# Altium footprint library Selex_PCBLib.PcbLib: 388 footprints (part 16 of 25)
Each footprint in its own frame and in the unit in brackets; x right, y up, seen from the top. Pads: shape width x height; smd on the part's side, far side on the other; paste and mask are expansions set on the pad; w line width, h text height; cw(c..) or ccw(c..) is an arc to the next point about the centre after c.
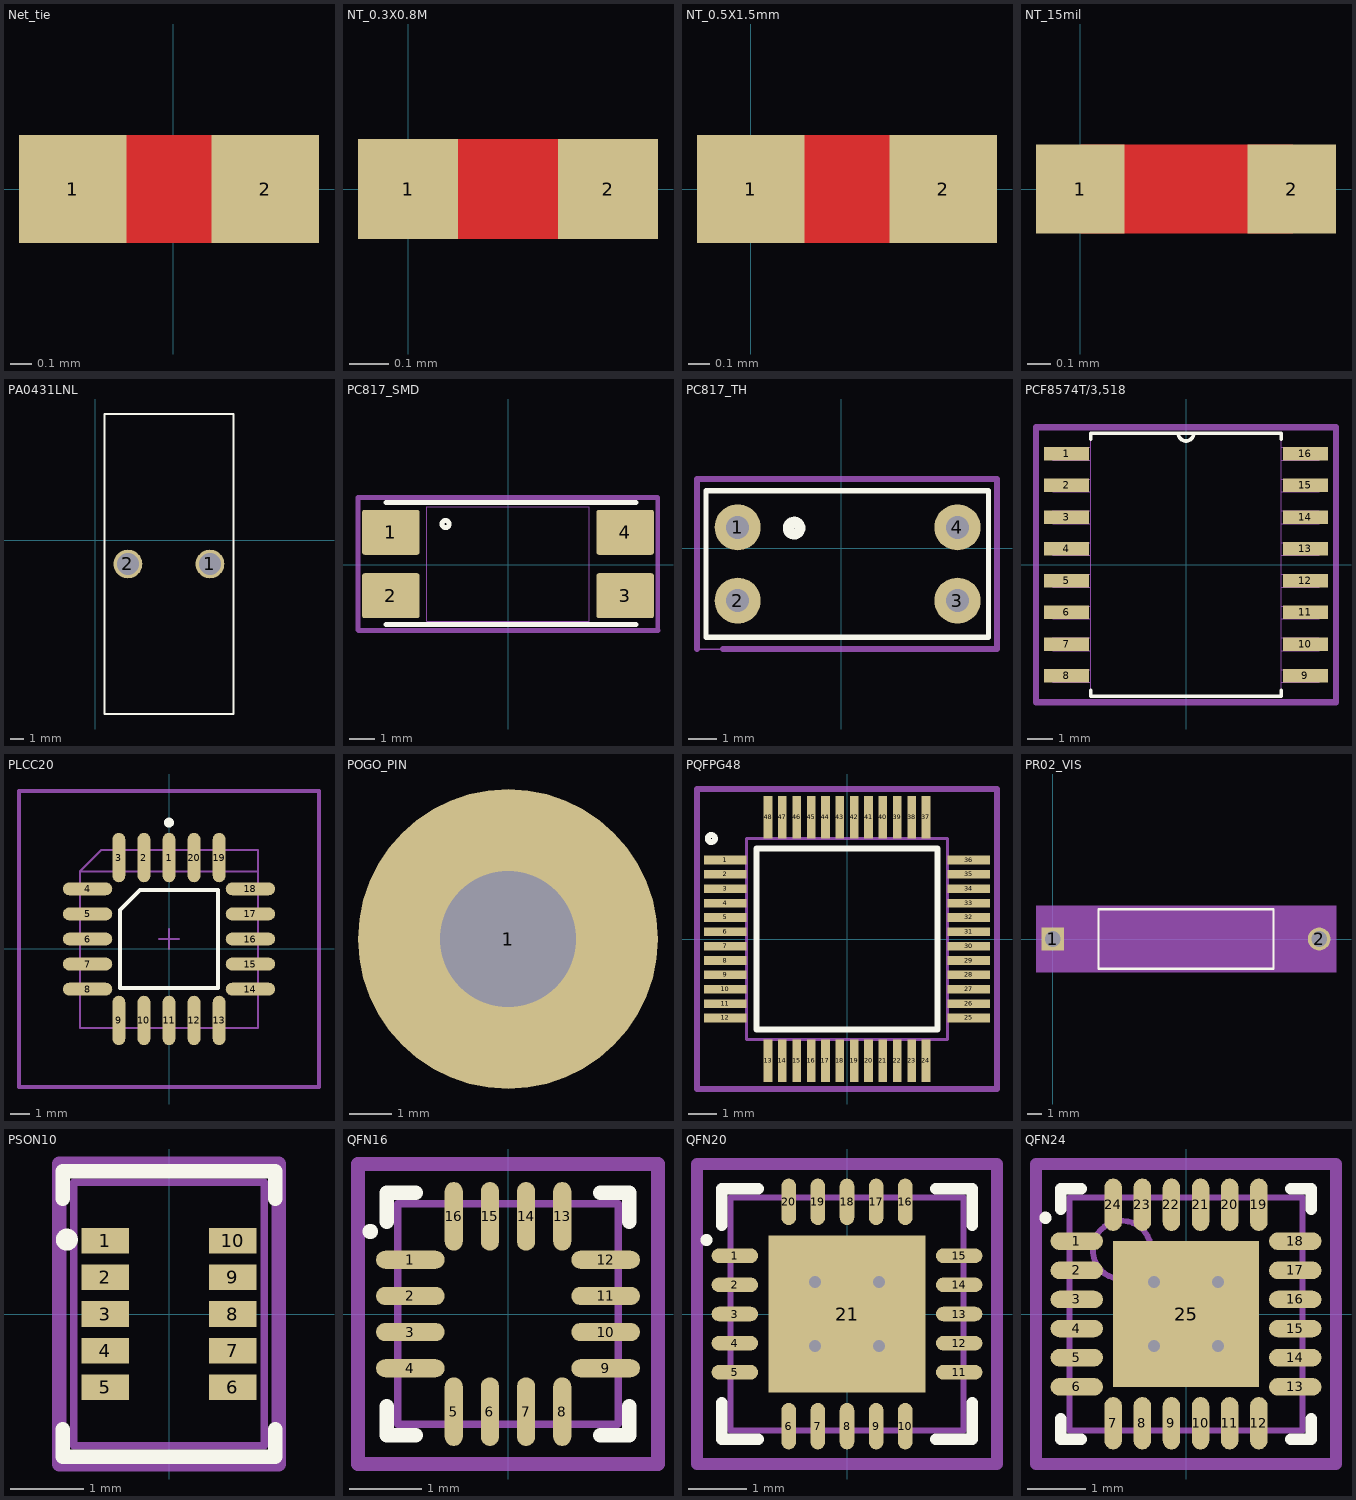
[diagram p15: the footprints below, top view; thin cyan lines are the x and y axes]

## Net_tie [mil]
pads (2):
  rect 20x20 smd paste-11.81 mask+0: 1(-18.7,0) 2(17.05,0)
Top Layer:
  rectangle: -18.7,-10 17.3,10

## NT_0.3X0.8M [mil]
pads (2):
  rect 10x10 smd paste-11.81 mask+0: 1(0,0) 2(20,0)
Top Layer:
  rectangle: 0,-5 20,5

## NT_0.5X1.5mm [mil]
pads (2):
  rect 20x20 smd paste-11.81 mask+0: 1(0,0) 2(35.75,0)
Top Layer:
  rectangle: 0,-10 36,10

## NT_15mil [mil]
pads (2):
  rect 15x15 smd paste-11.81 mask+0: 1(0,0) 2(35.75,0)
Top Layer:
  rectangle: 0,-7.5 36,7.5

## PA0431LNL [mil]
pads (2):
  round 84 hole 64: 1(336.46,-68.9) 2(96.46,-68.9)
Top Overlay:
  lines w6.57: 27.56,-507.87 405.51,-507.87 405.51,370.08 27.56,370.08 27.56,-507.87
3D body "IND_PA0431L_PUL.step": height 874.02, standoff -262.01, extent 30,-505.91 404.02,368.11

## PC817_SMD [mm]
pads (4):
  rrect10% 2.3x1.8 smd mask+0.05: 1(-4.715,1.3) 2(-4.715,-1.24) 3(4.675,-1.24) 4(4.675,1.3)
Top Overlay:
  circle w0.2: c-2.52,1.63 r0.141
  lines w0.2: -4.9,-2.4 5.1,-2.4 ; -4.9,2.5 5.1,2.5
Mechanical 1:
  lines w0.05: -3.27,-2.26 3.23,-2.26 3.23,2.32 -3.27,2.32 -3.27,-2.26
Mechanical 15:
  lines w0.1: -6.03,-2.62 -6.02,-2.63 ; 5.98,-2.63 5.99,-2.64
  lines w0.2: -6.03,-2.62 -6.03,-2.42 -6.03,2.7 5.98,2.7 5.98,-2.63 ; -6.02,-2.63 -5.77,-2.63 -5.76,-2.64 5.99,-2.64
3D body "User Library-PC817_Gullwing.STEP": height 3.75, standoff -0.1, extent -5.02,-2.26 4.98,2.32

## PC817_TH [mm]
pads (4):
  round 1.6 hole 0.8: 1(-3.59,0.72) 2(-3.59,-1.82) 3(4.03,-1.82) 4(4.03,0.72)
Top Overlay:
  circle w0.381: c-1.634,0.695 r0.203
  lines w0.178: -1.05,1.99 -4.69,1.99 -4.69,-3.09 5.11,-3.09 5.11,1.99 -1,1.99
Mechanical 15:
  lines w0.05: -5,-3.5 -4.1,-3.5
  lines w0.2: -5,-3.5 -5,2.4 5.4,2.4 5.4,-3.5 -4.1,-3.5
3D body "SW3DPS-DIP4-DEFAULT.STEP": height 4.31, standoff -3.28, extent -3.844,-3.32 4.156,2.22

## PCF8574T/3,518 [mil]
pads (16):
  rect 71x21 smd: 1(-188,175) 2(-188,125) 3(-188,75) 4(-188,25) 5(-188,-25) 6(-188,-75) 7(-188,-125) 8(-188,-175) 9(188,-175) 10(188,-125) 11(188,-75) 12(188,-25) 13(188,25) 14(188,75) 15(188,125) 16(188,175)
Top Overlay:
  lines w6: -150,-198 -150,-207 150,-207 150,-198 ; -150,198 -150,207 -12,207 ; 150,198 150,207 12,207 ; -12,207 ccw(c0,207) 12,207 ; -12,207 12,207
Mechanical 13:
  lines w0: -12,207 ccw(c0,207) 12,207 ; -12,207 -150,207 -150,-207 150,-207 150,207 12,207 ; -12,207 12,207 ; -210,-185 -150,-185 -150,-165 -210,-165 -210,-185 ; -210,-135 -150,-135 -150,-115 -210,-115 -210,-135 ; -210,-85 -150,-85 -150,-65 -210,-65 -210,-85 ; -210,-35 -150,-35 -150,-15 -210,-15 -210,-35 ; -210,15 -150,15 -150,35 -210,35 -210,15 ; -210,65 -150,65 -150,85 -210,85 -210,65 ; -210,115 -150,115 -150,135 -210,135 -210,115 ; -210,165 -150,165 -150,185 -210,185 -210,165 ; 150,-185 210,-185 210,-165 150,-165 150,-185 ; 150,-135 210,-135 210,-115 150,-115 150,-135 ; 150,-85 210,-85 210,-65 150,-65 150,-85 ; 150,-35 210,-35 210,-15 150,-15 150,-35 ; 150,15 210,15 210,35 150,35 150,15 ; 150,65 210,65 210,85 150,85 150,65 ; 150,115 210,115 210,135 150,135 150,115 ; 150,165 210,165 210,185 150,185 150,165
Mechanical 15:
  lines w10: -236.22,-216.54 236.22,-216.54 236.22,216.54 -39.37,216.54 -236.22,216.54 -236.22,-216.54
3D body "SOT162-1_NXP.step": height 104.09, standoff 0, extent -209.48,-206.49 209.5,206.5

## PLCC20 [mm] "PLCC_20_1P27-8P26"
pads (20):
  oval 0.65x2.5 smd: 1(0,4.625) 2(-1.27,4.625) 3(-2.54,4.625) 9(-2.54,-3.625) 10(-1.27,-3.625) 11(0,-3.625) 12(1.27,-3.625) 13(2.54,-3.625) 19(2.54,4.625) 20(1.27,4.625)
  oval 2.5x0.65 smd: 4(-4.125,3.04) 5(-4.125,1.77) 6(-4.125,0.5) 7(-4.125,-0.77) 8(-4.125,-2.04) 14(4.125,-2.04) 15(4.125,-0.77) 16(4.125,0.5) 17(4.125,1.77) 18(4.125,3.04)
Top Overlay:
  circle w0.25: c0,6.4 r0.127
  lines w0.2: -2.475,-1.975 -2.475,1.975 -1.475,2.975 2.475,2.975 2.475,-1.975 -2.475,-1.975
Mechanical 13:
  lines w0.1: 4.52,3.92 -4.52,3.92 ; -4.52,3.92 -3.42,5.02 4.52,5.02 4.52,-4.02 -4.52,-4.02 -4.52,3.92
Mechanical 15:
  lines w0.1: -0.5,0.5 0.5,0.5 ; 0,0 0,1
  lines w0.2: -7.6,-7 7.6,-7 7.6,8 -7.6,8 -7.6,-7
3D body "540-88-020-17-400-tr.stp": height 4.6, standoff -1.05, extent -7.43,-6.93 7.43,7.93

## POGO_PIN [mm]
pads (1):
  round 7 hole 3.175: 1(16.9,10.65)

## PQFPG48 [mm] "PQFPG48_0P5x8P5"
pads (48):
  rect 1.475x0.3 smd: 1(-4.238,2.75) 2(-4.238,2.25) 3(-4.238,1.75) 4(-4.238,1.25) 5(-4.238,0.75) 6(-4.238,0.25) 7(-4.238,-0.25) 8(-4.238,-0.75) 9(-4.238,-1.25) 10(-4.238,-1.75) 11(-4.238,-2.25) 12(-4.238,-2.75) 25(4.238,-2.75) 26(4.238,-2.25) 27(4.238,-1.75) 28(4.238,-1.25) 29(4.238,-0.75) 30(4.238,-0.25) 31(4.238,0.25) 32(4.238,0.75) 33(4.238,1.25) 34(4.238,1.75) 35(4.238,2.25) 36(4.238,2.75)
  rect 0.3x1.475 smd: 13(-2.75,-4.238) 14(-2.25,-4.238) 15(-1.75,-4.238) 16(-1.25,-4.238) 17(-0.75,-4.238) 18(-0.25,-4.238) 19(0.25,-4.238) 20(0.75,-4.238) 21(1.25,-4.238) 22(1.75,-4.238) 23(2.25,-4.238) 24(2.75,-4.238) 37(2.75,4.238) 38(2.25,4.238) 39(1.75,4.238) 40(1.25,4.238) 41(0.75,4.238) 42(0.25,4.238) 43(-0.25,4.238) 44(-0.75,4.238) 45(-1.25,4.238) 46(-1.75,4.238) 47(-2.25,4.238) 48(-2.75,4.238)
Top Overlay:
  circle w0.2: c-4.725,3.5 r0.125
  lines w0.2: -3.15,-3.15 3.15,-3.15 3.15,3.15 -3.15,3.15 -3.15,-3.15
Mechanical 13:
  lines w0.1: -3.5,-3.5 3.5,-3.5 3.5,3.5 -3.5,3.5 -3.5,-3.5
Mechanical 15:
  lines w0.2: -5.225,-5.225 5.225,-5.225 5.225,5.225 -5.225,5.225 -5.225,-5.225
3D body "BQ76952PFBR.stp": height 1.06, standoff -0.01, extent -4.5,-4.5 4.5,4.5

## PR02_VIS [mil]
pads (2):
  rect 62.68x62.68 hole 43 mask+0: 1(0,0)
  round 62.68 hole 43 mask+0: 2(733.86,0)
Top Overlay:
  lines w6: 125.71,-81.77 608.15,-81.77 608.15,81.77 125.71,81.77 125.71,-81.77
Mechanical 5:
  region: 780.2,-91.77 -46.34,-91.77 -46.34,91.77 780.2,91.77
Mechanical 13:
  lines w1: 0,0 130.71,0 ; 603.15,0 733.86,0 ; 130.71,-76.77 603.15,-76.77 603.15,76.77 130.71,76.77 130.71,-76.77
Mechanical 15:
  region: 120.71,-41.34 -41.34,-41.34 -41.34,41.34 120.71,41.34 120.71,86.77 613.15,86.77 613.15,41.34 775.2,41.34 775.2,-41.34 613.15,-41.34 613.15,-86.77 120.71,-86.77
  lines w6: -41.34,-41.34 -41.34,41.34 120.71,41.34 120.71,86.77 613.15,86.77 613.15,41.34 775.2,41.34 775.2,-41.34 613.15,-41.34 613.15,-86.77 120.71,-86.77 120.71,-41.34 -41.34,-41.34
3D body "PR02_VIS.step": height 153.54, standoff -110, extent -16.34,-76.64 750.2,76.64

## PSON10 [mm] "PSON 10 0P5-1P75"
pads (10):
  rect 0.65x0.35 smd: 1(-0.87,1) 2(-0.87,0.5) 3(-0.87,0) 4(-0.87,-0.5) 5(-0.87,-1) 6(0.87,-1) 7(0.87,-0.5) 8(0.87,0) 9(0.87,0.5) 10(0.87,1)
Top Overlay:
  circle w0.2: c-1.397,1.016 r0.05
  lines w0.2: -1.45,-1.575 -1.45,-1.95 1.45,-1.95 1.45,-1.575 ; -1.45,1.575 -1.45,1.95 1.45,1.95 1.45,1.575
Mechanical 13:
  lines w0.1: -1.3,-1.8 1.3,-1.8 1.3,1.8 -1.3,1.8 -1.3,-1.8
Mechanical 15:
  lines w0.2: -1.5,-2.05 1.5,-2.05 1.5,2.05 -1.5,2.05 -1.5,-2.05
3D body: height 1, standoff 0, extent -1.3,-1.8 1.3,1.8

## QFN16 [mm] "QFN 16 0P5-2P8"
pads (16):
  oval 0.95x0.25 smd: 1(-1.35,0.75) 2(-1.35,0.25) 3(-1.35,-0.25) 4(-1.35,-0.75) 9(1.35,-0.75) 10(1.35,-0.25) 11(1.35,0.25) 12(1.35,0.75)
  oval 0.25x0.95 smd: 5(-0.75,-1.35) 6(-0.25,-1.35) 7(0.25,-1.35) 8(0.75,-1.35) 13(0.75,1.35) 14(0.25,1.35) 15(-0.25,1.35) 16(-0.75,1.35)
Top Overlay:
  circle w0.2: c-1.905,1.143 r0.005
  lines w0.2: -1.675,-1.275 -1.675,-1.675 -1.275,-1.675 ; -1.675,1.275 -1.675,1.675 -1.275,1.675 ; 1.275,-1.675 1.675,-1.675 1.675,-1.275 ; 1.275,1.675 1.675,1.675 1.675,1.275
Mechanical 13:
  lines w0.1: -1.525,-1.525 1.523,-1.525 1.525,-1.523 1.525,1.525 -1.525,1.525 -1.525,-1.525
Mechanical 15:
  lines w0.2: -2.075,-2.075 -2.075,2.075 2.075,2.075 2.075,-2.075 -2.075,-2.075
3D body "ALSRobot-QFN16 3x3.STEP": height 0.9, standoff 0, extent -1.524,-1.524 1.518,1.518

## QFN20 [mm] "QFN 20 0P5-3P8"
pads (21):
  oval 0.8x0.25 smd: 1(-1.925,1) 2(-1.925,0.5) 3(-1.925,0) 4(-1.925,-0.5) 5(-1.925,-1) 11(1.925,-1) 12(1.925,-0.5) 13(1.925,0) 14(1.925,0.5) 15(1.925,1)
  oval 0.25x0.8 smd: 6(-1,-1.925) 7(-0.5,-1.925) 8(0,-1.925) 9(0.5,-1.925) 10(1,-1.925) 16(1,1.925) 17(0.5,1.925) 18(0,1.925) 19(-0.5,1.925) 20(-1,1.925)
  rect 2.7x2.7 smd: 21(0,0)
via -0.55,0.55 diameter 0.5 hole 0.2
via 0.55,0.55 diameter 0.5 hole 0.2
via -0.55,-0.55 diameter 0.5 hole 0.2
via 0.55,-0.55 diameter 0.5 hole 0.2
Top Overlay:
  circle w0.2: c-2.413,1.27 r0.005
  lines w0.2: -2.15,-1.525 -2.15,-2.15 -1.525,-2.15 ; -2.15,1.525 -2.15,2.15 -1.525,2.15 ; 1.525,-2.15 2.15,-2.15 2.15,-1.525 ; 1.525,2.15 2.15,2.15 2.15,1.525
Mechanical 13:
  lines w0.1: -2,-2 -2,2 2,2 2,-2 -2,-2
Mechanical 15:
  lines w0.2: -2.575,-2.575 -2.575,2.575 2.575,2.575 2.575,-2.575 -2.575,-2.575
3D body: height 1, standoff 0, extent -2,-2 2,2
3D body "User Library-QFN20 4x4.STEP": height 0.72, standoff -0.01, extent -2.024,-2.024 2.025,2.025

## QFN24 [mm] "QFN 24 0P5-3P6"
pads (25):
  oval 0.9x0.3 smd: 1(-1.875,1.25) 2(-1.875,0.75) 3(-1.875,0.25) 4(-1.875,-0.25) 5(-1.875,-0.75) 6(-1.875,-1.25) 13(1.875,-1.25) 14(1.875,-0.75) 15(1.875,-0.25) 16(1.875,0.25) 17(1.875,0.75) 18(1.875,1.25)
  oval 0.3x0.9 smd: 7(-1.25,-1.875) 8(-0.75,-1.875) 9(-0.25,-1.875) 10(0.25,-1.875) 11(0.75,-1.875) 12(1.25,-1.875) 19(1.25,1.875) 20(0.75,1.875) 21(0.25,1.875) 22(-0.25,1.875) 23(-0.75,1.875) 24(-1.25,1.875)
  rect 2.5x2.5 smd: 25(0,0)
via 0.55,-0.55 diameter 0.5 hole 0.2
via -0.55,-0.55 diameter 0.5 hole 0.2
via 0.55,0.55 diameter 0.5 hole 0.2
via -0.55,0.55 diameter 0.5 hole 0.2
Top Overlay:
  circle w0.2: c-2.413,1.651 r0.005
  lines w0.2: -2.15,-1.8 -2.15,-2.15 -1.8,-2.15 ; -2.15,1.8 -2.15,2.15 -1.8,2.15 ; 1.8,-2.15 2.15,-2.15 2.15,-1.8 ; 1.8,2.15 2.15,2.15 2.15,1.8
Mechanical 13:
  circle w0.1: c-1.1,1.1 r0.5
  lines w0.1: -2,-2 2,-2 2,2 -2,2 -2,-2
Mechanical 15:
  lines w0.2: -2.575,-2.575 2.575,-2.575 2.575,2.575 -2.575,2.575 -2.575,-2.575
3D body "User Library-QFN24_4x4.STEP": height 1, standoff 0, extent -2.01,-2.01 2.01,2.01